# Altium footprint library PcbLib1.PcbLib: 1016 footprints (part 24 of 64)
Each footprint in its own frame and in the unit in brackets; x right, y up, seen from the top. Pads: shape width x height; smd on the part's side, far side on the other; paste and mask are expansions set on the pad; w line width, h text height; cw(c..) or ccw(c..) is an arc to the next point about the centre after c.
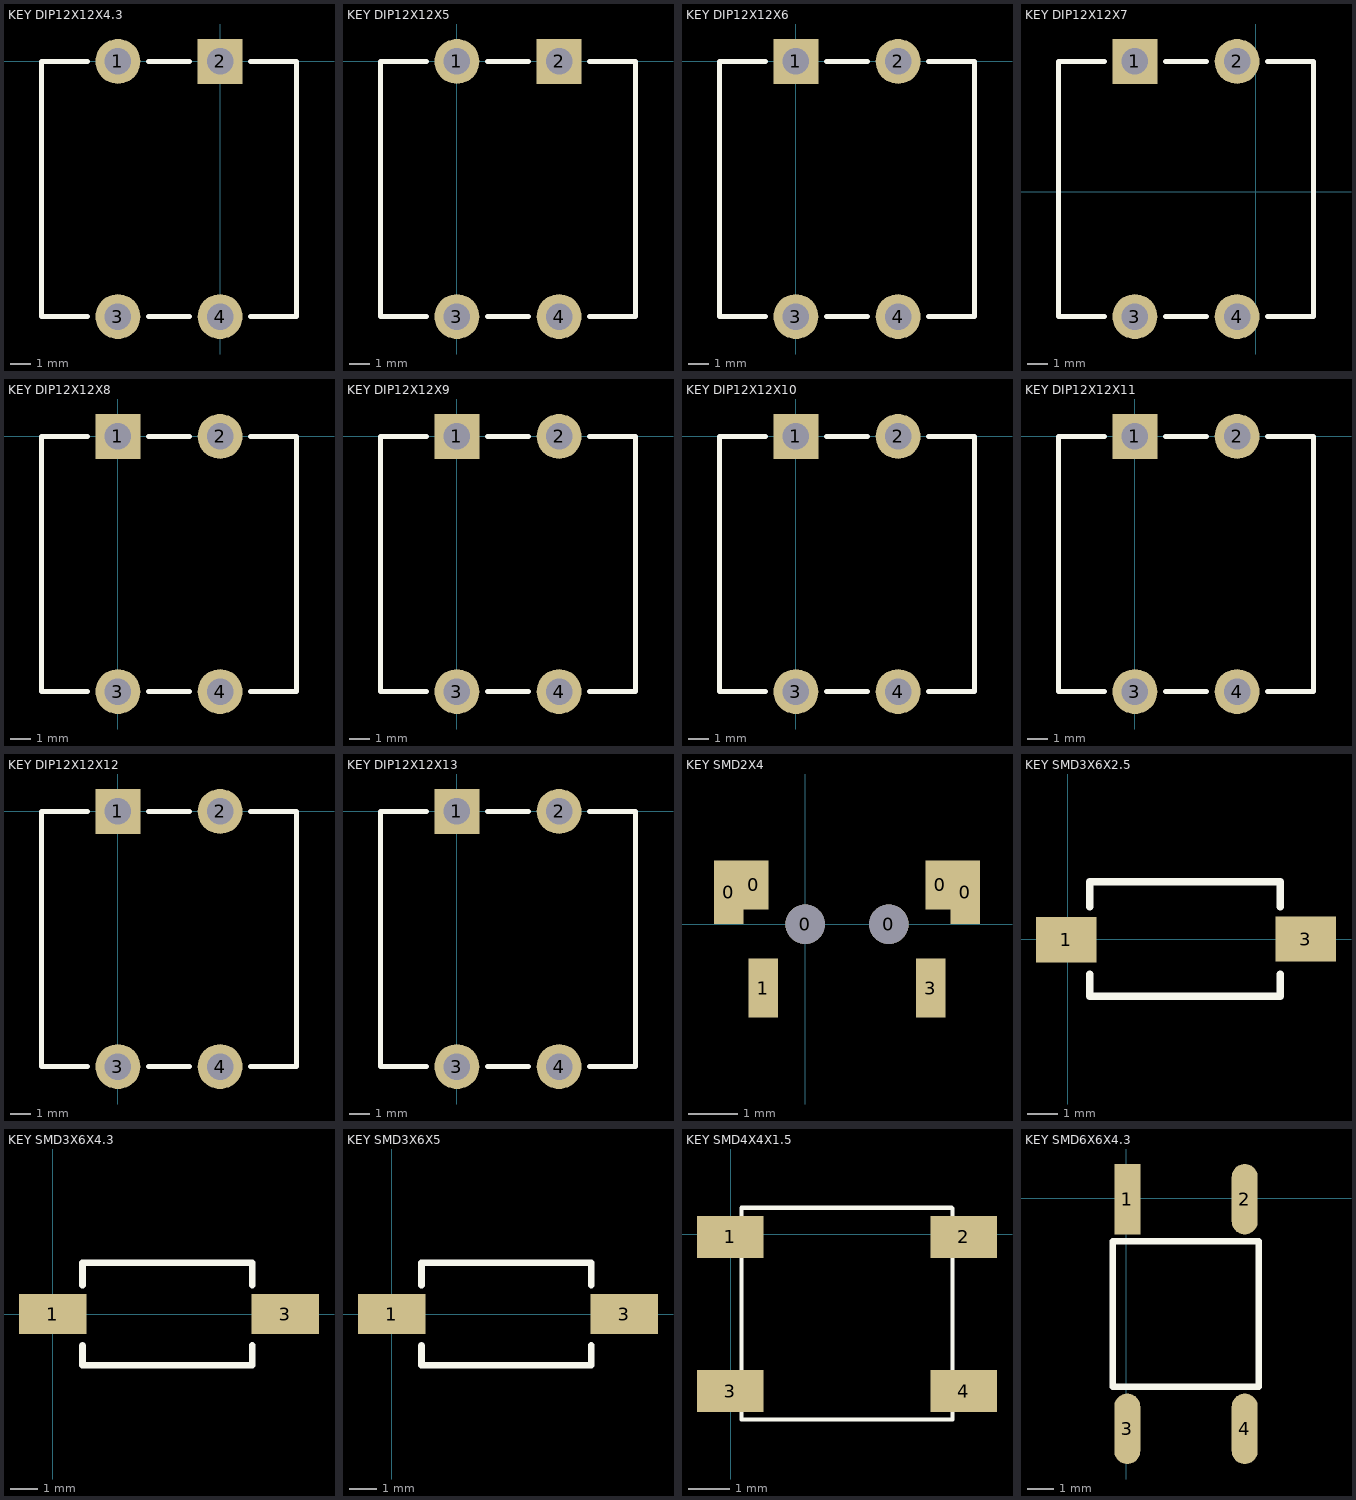
[diagram p23: the footprints below, top view; thin cyan lines are the x and y axes]

## KEY DIP12X12X4.3 [mm]
pads (4):
  round 2.2 hole 1.3: 1(-5,0) 3(-5,-12.5) 4(0,-12.5)
  rect 2.2x2.2 hole 1.3: 2(0,0)
Top Overlay:
  lines w0.254: -6.5,-12.5 -8.75,-12.5 -8.75,0 -6.5,0 ; -3.5,-12.5 -1.5,-12.5 ; -3.5,0 -1.5,0 ; 1.5,-12.5 3.75,-12.5 3.75,0 1.5,0
3D body "DIP-12X12X4.3.STEP": height 4.45, standoff -3.35, extent -8.54,-13.081 3.46,0.716

## KEY DIP12X12X5 [mm]
pads (4):
  round 2.2 hole 1.3: 1(0,0) 3(0,-12.5) 4(5,-12.5)
  rect 2.2x2.2 hole 1.3: 2(5,0)
Top Overlay:
  lines w0.254: -1.5,-12.5 -3.75,-12.5 -3.75,0 -1.5,0 ; 1.5,-12.5 3.5,-12.5 ; 1.5,0 3.5,0 ; 6.5,-12.5 8.75,-12.5 8.75,0 6.5,0
3D body "DIP-12X12X5.STEP": height 5.15, standoff -3.35, extent -3.46,-13.162 8.54,0.635

## KEY DIP12X12X6 [mm]
pads (4):
  rect 2.2x2.2 hole 1.3: 1(0,0)
  round 2.2 hole 1.3: 2(5,0) 3(0,-12.5) 4(5,-12.5)
Top Overlay:
  lines w0.254: -1.5,-12.5 -3.75,-12.5 -3.75,0 -1.5,0 ; 1.5,-12.5 3.5,-12.5 ; 1.5,0 3.5,0 ; 6.5,-12.5 8.75,-12.5 8.75,0 6.5,0
3D body "DIP-12X12X6.STEP": height 6.15, standoff -3.35, extent -3.46,-13.289 8.54,0.508

## KEY DIP12X12X7 [mm] "12*12*7mm"
pads (4):
  rect 2.2x2.2 hole 1.3: 1(-5.929,6.377)
  round 2.2 hole 1.3: 2(-0.929,6.377) 3(-5.929,-6.123) 4(-0.929,-6.123)
Top Overlay:
  lines w0.254: -7.429,-6.123 -9.679,-6.123 -9.679,6.377 -7.429,6.377 ; -4.429,-6.123 -2.429,-6.123 ; -4.429,6.377 -2.429,6.377 ; 0.571,-6.123 2.821,-6.123 2.821,6.377 0.571,6.377
3D body "DIP-12X12X7.STEP": height 7.15, standoff -3.35, extent -9.429,-6.685 2.571,7.112

## KEY DIP12X12X8 [mm]
pads (4):
  rect 2.2x2.2 hole 1.3: 1(0,0)
  round 2.2 hole 1.3: 2(5,0) 3(0,-12.5) 4(5,-12.5)
Top Overlay:
  lines w0.254: -1.5,-12.5 -3.75,-12.5 -3.75,0 -1.5,0 ; 1.5,-12.5 3.5,-12.5 ; 1.5,0 3.5,0 ; 6.5,-12.5 8.75,-12.5 8.75,0 6.5,0
3D body "DIP-12X12X8.STEP": height 8.15, standoff -3.35, extent -3.46,-13.081 8.54,0.716

## KEY DIP12X12X9 [mm]
pads (4):
  rect 2.2x2.2 hole 1.3: 1(0,0)
  round 2.2 hole 1.3: 2(5,0) 3(0,-12.5) 4(5,-12.5)
Top Overlay:
  lines w0.254: -1.5,-12.5 -3.75,-12.5 -3.75,0 -1.5,0 ; 1.5,-12.5 3.5,-12.5 ; 1.5,0 3.5,0 ; 6.5,-12.5 8.75,-12.5 8.75,0 6.5,0
3D body "DIP-12X12X9.STEP": height 9.15, standoff -3.35, extent -3.46,-13.289 8.54,0.508

## KEY DIP12X12X10 [mm]
pads (4):
  rect 2.2x2.2 hole 1.3: 1(0,0)
  round 2.2 hole 1.3: 2(5,0) 3(0,-12.5) 4(5,-12.5)
Top Overlay:
  lines w0.254: -1.5,-12.5 -3.75,-12.5 -3.75,0 -1.5,0 ; 1.5,-12.5 3.5,-12.5 ; 1.5,0 3.5,0 ; 6.5,-12.5 8.75,-12.5 8.75,0 6.5,0
3D body "DIP-12X12X10.STEP": height 10.15, standoff -3.35, extent -3.46,-13.289 8.54,0.508

## KEY DIP12X12X11 [mm]
pads (4):
  rect 2.2x2.2 hole 1.3: 1(0,0)
  round 2.2 hole 1.3: 2(5,0) 3(0,-12.5) 4(5,-12.5)
Top Overlay:
  lines w0.254: -1.5,-12.5 -3.75,-12.5 -3.75,0 -1.5,0 ; 1.5,-12.5 3.5,-12.5 ; 1.5,0 3.5,0 ; 6.5,-12.5 8.75,-12.5 8.75,0 6.5,0
3D body "DIP-12X12X11.STEP": height 11.15, standoff -3.35, extent -3.46,-13.208 8.54,0.589

## KEY DIP12X12X12 [mm]
pads (4):
  rect 2.2x2.2 hole 1.3: 1(0,0)
  round 2.2 hole 1.3: 2(5,0) 3(0,-12.5) 4(5,-12.5)
Top Overlay:
  lines w0.254: -1.5,-12.5 -3.75,-12.5 -3.75,0 -1.5,0 ; 1.5,-12.5 3.5,-12.5 ; 1.5,0 3.5,0 ; 6.5,-12.5 8.75,-12.5 8.75,0 6.5,0
3D body "DIP-12X12X12.STEP": height 12.15, standoff -3.35, extent -3.46,-13.081 8.54,0.716

## KEY DIP12X12X13 [mm]
pads (4):
  rect 2.2x2.2 hole 1.3: 1(0,0)
  round 2.2 hole 1.3: 2(5,0) 3(0,-12.5) 4(5,-12.5)
Top Overlay:
  lines w0.254: -1.5,-12.5 -3.75,-12.5 -3.75,0 -1.5,0 ; 1.5,-12.5 3.5,-12.5 ; 1.5,0 3.5,0 ; 6.5,-12.5 8.75,-12.5 8.75,0 6.5,0
3D body "DIP-12X12X13.STEP": height 13.31, standoff -3.19, extent -3.46,-13.208 8.54,0.589

## KEY SMD2X4 [mm]
pads (8):
  rect 0.6x1.3 smd: 0(-1.55,0.65) 0(3.25,0.65)
  rect 0.6x1 smd: 0(-1.05,0.8) 0(2.75,0.8)
  round 0.8 hole 0.8: 0(0,0) 0(1.7,0)
  rect 0.6x1.2 smd: 1(-0.85,-1.3) 3(2.55,-1.3)
3D body "User Library-it-1188e.STEP": height 3.5, standoff -0.7, extent -2.974,-1.8 4.826,1.8

## KEY SMD3X6X2.5 [mm]
pads (2):
  rect 2x1.5 smd: 1(-0.059,-0.02) 3(7.874,0)
Top Overlay:
  lines w0.254: 0.725,-1.168 0.725,-1.9 7.025,-1.9 7.025,-1.168 ; 0.725,1.067 0.725,1.9 7.025,1.9 7.025,1.067
3D body "SMD-3X6X2.5.STEP": height 2.59, standoff -0.03, extent -0.19,-1.778 7.81,1.722

## KEY SMD3X6X4.3 [mm]
pads (2):
  rect 2.5x1.5 smd: 1(0,0) 3(8.636,0)
Top Overlay:
  lines w0.254: 1.106,-1.168 1.106,-1.9 7.406,-1.9 7.406,-1.168 ; 1.106,1.067 1.106,1.9 7.406,1.9 7.406,1.067
3D body "SMD-3X6X4.3.STEP": height 4.4, standoff -0.03, extent -0.409,-1.778 8.791,1.722

## KEY SMD3X6X5 [mm]
pads (2):
  rect 2.5x1.5 smd: 1(0,0) 3(8.636,0)
Top Overlay:
  lines w0.254: 1.106,-1.168 1.106,-1.9 7.406,-1.9 7.406,-1.168 ; 1.106,1.067 1.106,1.9 7.406,1.9 7.406,1.067
3D body "SMD-3X6X5.STEP": height 5.1, standoff -0.03, extent -0.409,-1.722 8.791,1.778

## KEY SMD4X4X1.5 [mm]
pads (4):
  rect 1.6x1 smd: 1(-0.006,-0.065) 2(5.594,-0.065) 3(-0.006,-3.765) 4(5.594,-3.765)
Top Overlay:
  lines w0.1: 5.304,0.635 1.524,0.635 0.264,0.635 0.264,-4.445 5.324,-4.445 5.324,0.615
Mechanical 15:
  lines w0.1: -0.406,-4.015 -0.406,-3.515 0.573,-3.515 ; 5.015,-0.315 5.994,-0.315 5.994,0.185
3D body "SMD-4X4X1.5.STEP": height 2.38, standoff 0.88, extent -0.533,-4.572 5.867,0.628

## KEY SMD6X6X4.3 [mm]
pads (4):
  rect 1x2.7 smd: 1(0.047,-0.045)
  oval 1x2.7 smd: 2(4.547,-0.045) 3(0.047,-8.845) 4(4.547,-8.845)
Top Overlay:
  lines w0.254: -0.508,-7.239 5.08,-7.239 5.08,-1.651 -0.508,-1.651 -0.508,-7.239
3D body "SMD-6X6X4.3.STEP": height 4.25, standoff 0.05, extent -0.635,-8.818 5.365,0.182